# Altium footprint library ref-packages.PCBLIB: 1544 footprints (part 13 of 103)
Each footprint in its own frame and in the unit in brackets; x right, y up, seen from the top. Pads: shape width x height; smd on the part's side, far side on the other; paste and mask are expansions set on the pad; w line width, h text height; cw(c..) or ccw(c..) is an arc to the next point about the centre after c.
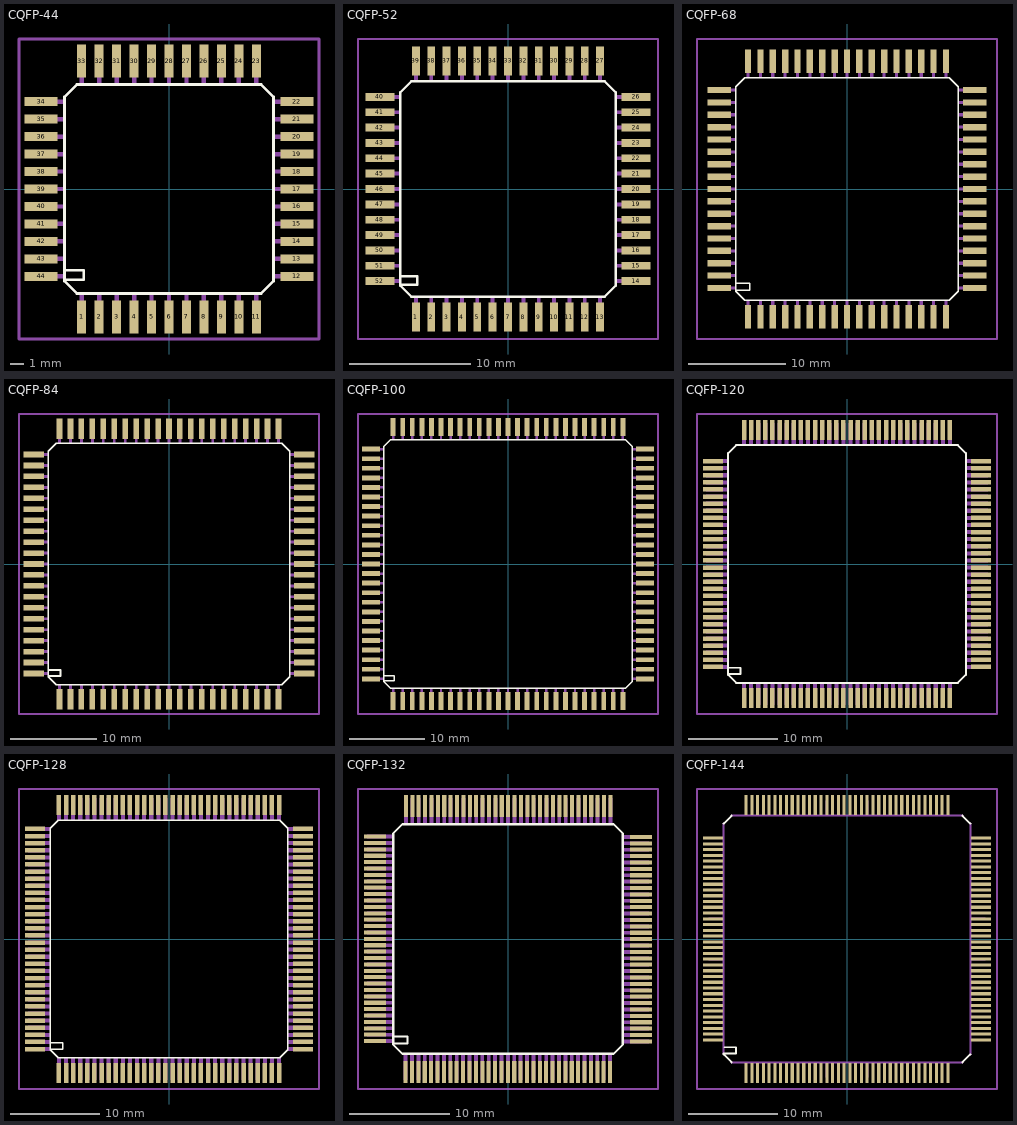
[diagram p12: the footprints below, top view; thin cyan lines are the x and y axes]

## CQFP-44 [mm]
pads (44):
  rect 0.65x2.4 smd: 1(-6.35,-9.3) 2(-5.08,-9.3) 3(-3.81,-9.3) 4(-2.54,-9.3) 5(-1.27,-9.3) 6(0,-9.3) 7(1.27,-9.3) 8(2.54,-9.3) 9(3.81,-9.3) 10(5.08,-9.3) 11(6.35,-9.3) 23(6.35,9.3) 24(5.08,9.3) 25(3.81,9.3) 26(2.54,9.3) 27(1.27,9.3) 28(0,9.3) 29(-1.27,9.3) 30(-2.54,9.3) 31(-3.81,9.3) 32(-5.08,9.3) 33(-6.35,9.3)
  rect 2.4x0.65 smd: 12(9.3,-6.35) 13(9.3,-5.08) 14(9.3,-3.81) 15(9.3,-2.54) 16(9.3,-1.27) 17(9.3,0) 18(9.3,1.27) 19(9.3,2.54) 20(9.3,3.81) 21(9.3,5.08) 22(9.3,6.35) 34(-9.3,6.35) 35(-9.3,5.08) 36(-9.3,3.81) 37(-9.3,2.54) 38(-9.3,1.27) 39(-9.3,0) 40(-9.3,-1.27) 41(-9.3,-2.54) 42(-9.3,-3.81) 43(-9.3,-5.08) 44(-9.3,-6.35)
Top Overlay:
  lines w0.203: -7.5,-5.9 -6.2,-5.9 -6.2,-6.6 -7.6,-6.6 ; -7.6,-6.6 -7.6,6.7 -6.7,7.6 6.7,7.6 7.6,6.7 7.6,-6.7 6.7,-7.6 -6.7,-7.6 -7.6,-6.7 -7.6,-6.6
Mechanical 16:
  rectangle: -6.51,-10.1 -6.19,-7.6
  rectangle: -5.24,-10.1 -4.92,-7.6
  rectangle: -3.97,-10.1 -3.65,-7.6
  rectangle: -2.7,-10.1 -2.38,-7.6
  rectangle: -1.43,-10.1 -1.11,-7.6
  rectangle: -0.16,-10.1 0.16,-7.6
  rectangle: 1.11,-10.1 1.43,-7.6
  rectangle: 2.38,-10.1 2.7,-7.6
  rectangle: 3.65,-10.1 3.97,-7.6
  rectangle: 4.92,-10.1 5.24,-7.6
  rectangle: 6.19,-10.1 6.51,-7.6
  rectangle: 7.6,-6.51 10.1,-6.19
  rectangle: 7.6,-5.24 10.1,-4.92
  rectangle: 7.6,-3.97 10.1,-3.65
  rectangle: 7.6,-2.7 10.1,-2.38
  rectangle: 7.6,-1.43 10.1,-1.11
  rectangle: 7.6,-0.16 10.1,0.16
  rectangle: 7.6,1.11 10.1,1.43
  rectangle: 7.6,2.38 10.1,2.7
  rectangle: 7.6,3.65 10.1,3.97
  rectangle: 7.6,4.92 10.1,5.24
  rectangle: 7.6,6.19 10.1,6.51
  rectangle: 6.19,7.6 6.51,10.1
  rectangle: 4.92,7.6 5.24,10.1
  rectangle: 3.65,7.6 3.97,10.1
  rectangle: 2.38,7.6 2.7,10.1
  rectangle: 1.11,7.6 1.43,10.1
  rectangle: -0.16,7.6 0.16,10.1
  rectangle: -1.43,7.6 -1.11,10.1
  rectangle: -2.7,7.6 -2.38,10.1
  rectangle: -3.97,7.6 -3.65,10.1
  rectangle: -5.24,7.6 -4.92,10.1
  rectangle: -6.51,7.6 -6.19,10.1
  rectangle: -10.1,6.19 -7.6,6.51
  rectangle: -10.1,4.92 -7.6,5.24
  rectangle: -10.1,3.65 -7.6,3.97
  rectangle: -10.1,2.38 -7.6,2.7
  rectangle: -10.1,1.11 -7.6,1.43
  rectangle: -10.1,-0.16 -7.6,0.16
  rectangle: -10.1,-1.43 -7.6,-1.11
  rectangle: -10.1,-2.7 -7.6,-2.38
  rectangle: -10.1,-3.97 -7.6,-3.65
  rectangle: -10.1,-5.24 -7.6,-4.92
  rectangle: -10.1,-6.51 -7.6,-6.19
Mechanical 27:
  lines w0.2: -10.903,-10.903 10.903,-10.903 10.903,10.903 -10.903,10.903 -10.903,-10.903

## CQFP-52 [mm]
pads (52):
  rect 0.65x2.4 smd: 1(-7.62,-10.6) 2(-6.35,-10.6) 3(-5.08,-10.6) 4(-3.81,-10.6) 5(-2.54,-10.6) 6(-1.27,-10.6) 7(0,-10.6) 8(1.27,-10.6) 9(2.54,-10.6) 10(3.81,-10.6) 11(5.08,-10.6) 12(6.35,-10.6) 13(7.62,-10.6) 27(7.62,10.6) 28(6.35,10.6) 29(5.08,10.6) 30(3.81,10.6) 31(2.54,10.6) 32(1.27,10.6) 33(0,10.6) 34(-1.27,10.6) 35(-2.54,10.6) 36(-3.81,10.6) 37(-5.08,10.6) 38(-6.35,10.6) 39(-7.62,10.6)
  rect 2.4x0.65 smd: 14(10.6,-7.62) 15(10.6,-6.35) 16(10.6,-5.08) 17(10.6,-3.81) 18(10.6,-2.54) 19(10.6,-1.27) 20(10.6,0) 21(10.6,1.27) 22(10.6,2.54) 23(10.6,3.81) 24(10.6,5.08) 25(10.6,6.35) 26(10.6,7.62) 40(-10.6,7.62) 41(-10.6,6.35) 42(-10.6,5.08) 43(-10.6,3.81) 44(-10.6,2.54) 45(-10.6,1.27) 46(-10.6,0) 47(-10.6,-1.27) 48(-10.6,-2.54) 49(-10.6,-3.81) 50(-10.6,-5.08) 51(-10.6,-6.35) 52(-10.6,-7.62)
Top Overlay:
  lines w0.203: -8.8,-7.2 -7.5,-7.2 -7.5,-7.9 -8.9,-7.9 ; -8.9,-7.9 -8.9,8 -8,8.9 8,8.9 8.9,8 8.9,-8 8,-8.9 -8,-8.9 -8.9,-8 -8.9,-7.9
Mechanical 16:
  rectangle: -7.78,-11.4 -7.46,-8.9
  rectangle: -6.51,-11.4 -6.19,-8.9
  rectangle: -5.24,-11.4 -4.92,-8.9
  rectangle: -3.97,-11.4 -3.65,-8.9
  rectangle: -2.7,-11.4 -2.38,-8.9
  rectangle: -1.43,-11.4 -1.11,-8.9
  rectangle: -0.16,-11.4 0.16,-8.9
  rectangle: 1.11,-11.4 1.43,-8.9
  rectangle: 2.38,-11.4 2.7,-8.9
  rectangle: 3.65,-11.4 3.97,-8.9
  rectangle: 4.92,-11.4 5.24,-8.9
  rectangle: 6.19,-11.4 6.51,-8.9
  rectangle: 7.46,-11.4 7.78,-8.9
  rectangle: 8.9,-7.78 11.4,-7.46
  rectangle: 8.9,-6.51 11.4,-6.19
  rectangle: 8.9,-5.24 11.4,-4.92
  rectangle: 8.9,-3.97 11.4,-3.65
  rectangle: 8.9,-2.7 11.4,-2.38
  rectangle: 8.9,-1.43 11.4,-1.11
  rectangle: 8.9,-0.16 11.4,0.16
  rectangle: 8.9,1.11 11.4,1.43
  rectangle: 8.9,2.38 11.4,2.7
  rectangle: 8.9,3.65 11.4,3.97
  rectangle: 8.9,4.92 11.4,5.24
  rectangle: 8.9,6.19 11.4,6.51
  rectangle: 8.9,7.46 11.4,7.78
  rectangle: 7.46,8.9 7.78,11.4
  rectangle: 6.19,8.9 6.51,11.4
  rectangle: 4.92,8.9 5.24,11.4
  rectangle: 3.65,8.9 3.97,11.4
  rectangle: 2.38,8.9 2.7,11.4
  rectangle: 1.11,8.9 1.43,11.4
  rectangle: -0.16,8.9 0.16,11.4
  rectangle: -1.43,8.9 -1.11,11.4
  rectangle: -2.7,8.9 -2.38,11.4
  rectangle: -3.97,8.9 -3.65,11.4
  rectangle: -5.24,8.9 -4.92,11.4
  rectangle: -6.51,8.9 -6.19,11.4
  rectangle: -7.78,8.9 -7.46,11.4
  rectangle: -11.4,7.46 -8.9,7.78
  rectangle: -11.4,6.19 -8.9,6.51
  rectangle: -11.4,4.92 -8.9,5.24
  rectangle: -11.4,3.65 -8.9,3.97
  rectangle: -11.4,2.38 -8.9,2.7
  rectangle: -11.4,1.11 -8.9,1.43
  rectangle: -11.4,-0.16 -8.9,0.16
  rectangle: -11.4,-1.43 -8.9,-1.11
  rectangle: -11.4,-2.7 -8.9,-2.38
  rectangle: -11.4,-3.97 -8.9,-3.65
  rectangle: -11.4,-5.24 -8.9,-4.92
  rectangle: -11.4,-6.51 -8.9,-6.19
  rectangle: -11.4,-7.78 -8.9,-7.46
Mechanical 27:
  lines w0.2: -12.403,-12.403 12.403,-12.403 12.403,12.403 -12.403,12.403 -12.403,-12.403

## CQFP-68 [mm]
pads (68):
  rect 0.65x2.4 smd: 1(-10.16,-13.1) 2(-8.89,-13.1) 3(-7.62,-13.1) 4(-6.35,-13.1) 5(-5.08,-13.1) 6(-3.81,-13.1) 7(-2.54,-13.1) 8(-1.27,-13.1) 9(0,-13.1) 10(1.27,-13.1) 11(2.54,-13.1) 12(3.81,-13.1) 13(5.08,-13.1) 14(6.35,-13.1) 15(7.62,-13.1) 16(8.89,-13.1) 17(10.16,-13.1) 35(10.16,13.1) 36(8.89,13.1) 37(7.62,13.1) 38(6.35,13.1) 39(5.08,13.1) 40(3.81,13.1) 41(2.54,13.1) 42(1.27,13.1) 43(0,13.1) 44(-1.27,13.1) 45(-2.54,13.1) 46(-3.81,13.1) 47(-5.08,13.1) 48(-6.35,13.1) 49(-7.62,13.1) 50(-8.89,13.1) 51(-10.16,13.1)
  rect 2.4x0.65 smd: 18(13.1,-10.16) 19(13.1,-8.89) 20(13.1,-7.62) 21(13.1,-6.35) 22(13.1,-5.08) 23(13.1,-3.81) 24(13.1,-2.54) 25(13.1,-1.27) 26(13.1,0) 27(13.1,1.27) 28(13.1,2.54) 29(13.1,3.81) 30(13.1,5.08) 31(13.1,6.35) 32(13.1,7.62) 33(13.1,8.89) 34(13.1,10.16) 52(-13.1,10.16) 53(-13.1,8.89) 54(-13.1,7.62) 55(-13.1,6.35) 56(-13.1,5.08) 57(-13.1,3.81) 58(-13.1,2.54) 59(-13.1,1.27) 60(-13.1,0) 61(-13.1,-1.27) 62(-13.1,-2.54) 63(-13.1,-3.81) 64(-13.1,-5.08) 65(-13.1,-6.35) 66(-13.1,-7.62) 67(-13.1,-8.89) 68(-13.1,-10.16)
Top Overlay:
  lines w0.152: -11.3,-9.7 -10,-9.7 -10,-10.4 -11.4,-10.4 ; -11.4,-10.4 -11.4,10.5 -10.5,11.4 10.5,11.4 11.4,10.5 11.4,-10.5 10.5,-11.4 -10.5,-11.4 -11.4,-10.5 -11.4,-10.4
Mechanical 16:
  rectangle: -10.32,-13.9 -10,-11.4
  rectangle: -9.05,-13.9 -8.73,-11.4
  rectangle: -7.78,-13.9 -7.46,-11.4
  rectangle: -6.51,-13.9 -6.19,-11.4
  rectangle: -5.24,-13.9 -4.92,-11.4
  rectangle: -3.97,-13.9 -3.65,-11.4
  rectangle: -2.7,-13.9 -2.38,-11.4
  rectangle: -1.43,-13.9 -1.11,-11.4
  rectangle: -0.16,-13.9 0.16,-11.4
  rectangle: 1.11,-13.9 1.43,-11.4
  rectangle: 2.38,-13.9 2.7,-11.4
  rectangle: 3.65,-13.9 3.97,-11.4
  rectangle: 4.92,-13.9 5.24,-11.4
  rectangle: 6.19,-13.9 6.51,-11.4
  rectangle: 7.46,-13.9 7.78,-11.4
  rectangle: 8.73,-13.9 9.05,-11.4
  rectangle: 10,-13.9 10.32,-11.4
  rectangle: 11.4,-10.32 13.9,-10
  rectangle: 11.4,-9.05 13.9,-8.73
  rectangle: 11.4,-7.78 13.9,-7.46
  rectangle: 11.4,-6.51 13.9,-6.19
  rectangle: 11.4,-5.24 13.9,-4.92
  rectangle: 11.4,-3.97 13.9,-3.65
  rectangle: 11.4,-2.7 13.9,-2.38
  rectangle: 11.4,-1.43 13.9,-1.11
  rectangle: 11.4,-0.16 13.9,0.16
  rectangle: 11.4,1.11 13.9,1.43
  rectangle: 11.4,2.38 13.9,2.7
  rectangle: 11.4,3.65 13.9,3.97
  rectangle: 11.4,4.92 13.9,5.24
  rectangle: 11.4,6.19 13.9,6.51
  rectangle: 11.4,7.46 13.9,7.78
  rectangle: 11.4,8.73 13.9,9.05
  rectangle: 11.4,10 13.9,10.32
  rectangle: 10,11.4 10.32,13.9
  rectangle: 8.73,11.4 9.05,13.9
  rectangle: 7.46,11.4 7.78,13.9
  rectangle: 6.19,11.4 6.51,13.9
  rectangle: 4.92,11.4 5.24,13.9
  rectangle: 3.65,11.4 3.97,13.9
  rectangle: 2.38,11.4 2.7,13.9
  rectangle: 1.11,11.4 1.43,13.9
  rectangle: -0.16,11.4 0.16,13.9
  rectangle: -1.43,11.4 -1.11,13.9
  rectangle: -2.7,11.4 -2.38,13.9
  rectangle: -3.97,11.4 -3.65,13.9
  rectangle: -5.24,11.4 -4.92,13.9
  rectangle: -6.51,11.4 -6.19,13.9
  rectangle: -7.78,11.4 -7.46,13.9
  rectangle: -9.05,11.4 -8.73,13.9
  rectangle: -10.32,11.4 -10,13.9
  rectangle: -13.9,10 -11.4,10.32
  rectangle: -13.9,8.73 -11.4,9.05
  rectangle: -13.9,7.46 -11.4,7.78
  rectangle: -13.9,6.19 -11.4,6.51
  rectangle: -13.9,4.92 -11.4,5.24
  rectangle: -13.9,3.65 -11.4,3.97
  rectangle: -13.9,2.38 -11.4,2.7
  rectangle: -13.9,1.11 -11.4,1.43
  rectangle: -13.9,-0.16 -11.4,0.16
  rectangle: -13.9,-1.43 -11.4,-1.11
  rectangle: -13.9,-2.7 -11.4,-2.38
  rectangle: -13.9,-3.97 -11.4,-3.65
  rectangle: -13.9,-5.24 -11.4,-4.92
  rectangle: -13.9,-6.51 -11.4,-6.19
  rectangle: -13.9,-7.78 -11.4,-7.46
  rectangle: -13.9,-9.05 -11.4,-8.73
  rectangle: -13.9,-10.32 -11.4,-10
Mechanical 27:
  lines w0.2: -15.403,-15.403 15.403,-15.403 15.403,15.403 -15.403,15.403 -15.403,-15.403

## CQFP-84 [mm]
pads (84):
  rect 0.65x2.4 smd: 1(-12.7,-15.7) 2(-11.43,-15.7) 3(-10.16,-15.7) 4(-8.89,-15.7) 5(-7.62,-15.7) 6(-6.35,-15.7) 7(-5.08,-15.7) 8(-3.81,-15.7) 9(-2.54,-15.7) 10(-1.27,-15.7) 11(0,-15.7) 12(1.27,-15.7) 13(2.54,-15.7) 14(3.81,-15.7) 15(5.08,-15.7) 16(6.35,-15.7) 17(7.62,-15.7) 18(8.89,-15.7) 19(10.16,-15.7) 20(11.43,-15.7) 21(12.7,-15.7) 43(12.7,15.7) 44(11.43,15.7) 45(10.16,15.7) 46(8.89,15.7) 47(7.62,15.7) 48(6.35,15.7) 49(5.08,15.7) 50(3.81,15.7) 51(2.54,15.7) 52(1.27,15.7) 53(0,15.7) 54(-1.27,15.7) 55(-2.54,15.7) 56(-3.81,15.7) 57(-5.08,15.7) 58(-6.35,15.7) 59(-7.62,15.7) 60(-8.89,15.7) 61(-10.16,15.7) 62(-11.43,15.7) 63(-12.7,15.7)
  rect 2.4x0.65 smd: 22(15.7,-12.7) 23(15.7,-11.43) 24(15.7,-10.16) 25(15.7,-8.89) 26(15.7,-7.62) 27(15.7,-6.35) 28(15.7,-5.08) 29(15.7,-3.81) 30(15.7,-2.54) 31(15.7,-1.27) 32(15.7,0) 33(15.7,1.27) 34(15.7,2.54) 35(15.7,3.81) 36(15.7,5.08) 37(15.7,6.35) 38(15.7,7.62) 39(15.7,8.89) 40(15.7,10.16) 41(15.7,11.43) 42(15.7,12.7) 64(-15.7,12.7) 65(-15.7,11.43) 66(-15.7,10.16) 67(-15.7,8.89) 68(-15.7,7.62) 69(-15.7,6.35) 70(-15.7,5.08) 71(-15.7,3.81) 72(-15.7,2.54) 73(-15.7,1.27) 74(-15.7,0) 75(-15.7,-1.27) 76(-15.7,-2.54) 77(-15.7,-3.81) 78(-15.7,-5.08) 79(-15.7,-6.35) 80(-15.7,-7.62) 81(-15.7,-8.89) 82(-15.7,-10.16) 83(-15.7,-11.43) 84(-15.7,-12.7)
Top Overlay:
  lines w0.203: -13.9,-12.3 -12.6,-12.3 -12.6,-13 -14,-13 ; -14,-13 -14,13.1 -13.1,14 13.1,14 14,13.1 14,-13.1 13.1,-14 -13.1,-14 -14,-13.1 -14,-13
Mechanical 16:
  rectangle: -12.86,-16.5 -12.54,-14
  rectangle: -11.59,-16.5 -11.27,-14
  rectangle: -10.32,-16.5 -10,-14
  rectangle: -9.05,-16.5 -8.73,-14
  rectangle: -7.78,-16.5 -7.46,-14
  rectangle: -6.51,-16.5 -6.19,-14
  rectangle: -5.24,-16.5 -4.92,-14
  rectangle: -3.97,-16.5 -3.65,-14
  rectangle: -2.7,-16.5 -2.38,-14
  rectangle: -1.43,-16.5 -1.11,-14
  rectangle: -0.16,-16.5 0.16,-14
  rectangle: 1.11,-16.5 1.43,-14
  rectangle: 2.38,-16.5 2.7,-14
  rectangle: 3.65,-16.5 3.97,-14
  rectangle: 4.92,-16.5 5.24,-14
  rectangle: 6.19,-16.5 6.51,-14
  rectangle: 7.46,-16.5 7.78,-14
  rectangle: 8.73,-16.5 9.05,-14
  rectangle: 10,-16.5 10.32,-14
  rectangle: 11.27,-16.5 11.59,-14
  rectangle: 12.54,-16.5 12.86,-14
  rectangle: 14,-12.86 16.5,-12.54
  rectangle: 14,-11.59 16.5,-11.27
  rectangle: 14,-10.32 16.5,-10
  rectangle: 14,-9.05 16.5,-8.73
  rectangle: 14,-7.78 16.5,-7.46
  rectangle: 14,-6.51 16.5,-6.19
  rectangle: 14,-5.24 16.5,-4.92
  rectangle: 14,-3.97 16.5,-3.65
  rectangle: 14,-2.7 16.5,-2.38
  rectangle: 14,-1.43 16.5,-1.11
  rectangle: 14,-0.16 16.5,0.16
  rectangle: 14,1.11 16.5,1.43
  rectangle: 14,2.38 16.5,2.7
  rectangle: 14,3.65 16.5,3.97
  rectangle: 14,4.92 16.5,5.24
  rectangle: 14,6.19 16.5,6.51
  rectangle: 14,7.46 16.5,7.78
  rectangle: 14,8.73 16.5,9.05
  rectangle: 14,10 16.5,10.32
  rectangle: 14,11.27 16.5,11.59
  rectangle: 14,12.54 16.5,12.86
  rectangle: 12.54,14 12.86,16.5
  rectangle: 11.27,14 11.59,16.5
  rectangle: 10,14 10.32,16.5
  rectangle: 8.73,14 9.05,16.5
  rectangle: 7.46,14 7.78,16.5
  rectangle: 6.19,14 6.51,16.5
  rectangle: 4.92,14 5.24,16.5
  rectangle: 3.65,14 3.97,16.5
  rectangle: 2.38,14 2.7,16.5
  rectangle: 1.11,14 1.43,16.5
  rectangle: -0.16,14 0.16,16.5
  rectangle: -1.43,14 -1.11,16.5
  rectangle: -2.7,14 -2.38,16.5
  rectangle: -3.97,14 -3.65,16.5
  rectangle: -5.24,14 -4.92,16.5
  rectangle: -6.51,14 -6.19,16.5
  rectangle: -7.78,14 -7.46,16.5
  rectangle: -9.05,14 -8.73,16.5
  rectangle: -10.32,14 -10,16.5
  rectangle: -11.59,14 -11.27,16.5
  rectangle: -12.86,14 -12.54,16.5
  rectangle: -16.5,12.54 -14,12.86
  rectangle: -16.5,11.27 -14,11.59
  rectangle: -16.5,10 -14,10.32
  rectangle: -16.5,8.73 -14,9.05
  rectangle: -16.5,7.46 -14,7.78
  rectangle: -16.5,6.19 -14,6.51
  rectangle: -16.5,4.92 -14,5.24
  rectangle: -16.5,3.65 -14,3.97
  rectangle: -16.5,2.38 -14,2.7
  rectangle: -16.5,1.11 -14,1.43
  rectangle: -16.5,-0.16 -14,0.16
  rectangle: -16.5,-1.43 -14,-1.11
  rectangle: -16.5,-2.7 -14,-2.38
  rectangle: -16.5,-3.97 -14,-3.65
  rectangle: -16.5,-5.24 -14,-4.92
  rectangle: -16.5,-6.51 -14,-6.19
  rectangle: -16.5,-7.78 -14,-7.46
  rectangle: -16.5,-9.05 -14,-8.73
  rectangle: -16.5,-10.32 -14,-10
  rectangle: -16.5,-11.59 -14,-11.27
  rectangle: -16.5,-12.86 -14,-12.54
Mechanical 27:
  lines w0.2: -17.403,-17.403 17.403,-17.403 17.403,17.403 -17.403,17.403 -17.403,-17.403

## CQFP-100 [mm]
pads (100):
  rect 0.65x2.4 smd: 1(-15.24,-18.2) 2(-13.97,-18.2) 3(-12.7,-18.2) 4(-11.43,-18.2) 5(-10.16,-18.2) 6(-8.89,-18.2) 7(-7.62,-18.2) 8(-6.35,-18.2) 9(-5.08,-18.2) 10(-3.81,-18.2) 11(-2.54,-18.2) 12(-1.27,-18.2) 13(0,-18.2) 14(1.27,-18.2) 15(2.54,-18.2) 16(3.81,-18.2) 17(5.08,-18.2) 18(6.35,-18.2) 19(7.62,-18.2) 20(8.89,-18.2) 21(10.16,-18.2) 22(11.43,-18.2) 23(12.7,-18.2) 24(13.97,-18.2) 25(15.24,-18.2) 51(15.24,18.2) 52(13.97,18.2) 53(12.7,18.2) 54(11.43,18.2) 55(10.16,18.2) 56(8.89,18.2) 57(7.62,18.2) 58(6.35,18.2) 59(5.08,18.2) 60(3.81,18.2) 61(2.54,18.2) 62(1.27,18.2) 63(0,18.2) 64(-1.27,18.2) 65(-2.54,18.2) 66(-3.81,18.2) 67(-5.08,18.2) 68(-6.35,18.2) 69(-7.62,18.2) 70(-8.89,18.2) 71(-10.16,18.2) 72(-11.43,18.2) 73(-12.7,18.2) 74(-13.97,18.2) 75(-15.24,18.2)
  rect 2.4x0.65 smd: 26(18.2,-15.24) 27(18.2,-13.97) 28(18.2,-12.7) 29(18.2,-11.43) 30(18.2,-10.16) 31(18.2,-8.89) 32(18.2,-7.62) 33(18.2,-6.35) 34(18.2,-5.08) 35(18.2,-3.81) 36(18.2,-2.54) 37(18.2,-1.27) 38(18.2,0) 39(18.2,1.27) 40(18.2,2.54) 41(18.2,3.81) 42(18.2,5.08) 43(18.2,6.35) 44(18.2,7.62) 45(18.2,8.89) 46(18.2,10.16) 47(18.2,11.43) 48(18.2,12.7) 49(18.2,13.97) 50(18.2,15.24) 76(-18.2,15.24) 77(-18.2,13.97) 78(-18.2,12.7) 79(-18.2,11.43) 80(-18.2,10.16) 81(-18.2,8.89) 82(-18.2,7.62) 83(-18.2,6.35) 84(-18.2,5.08) 85(-18.2,3.81) 86(-18.2,2.54) 87(-18.2,1.27) 88(-18.2,0) 89(-18.2,-1.27) 90(-18.2,-2.54) 91(-18.2,-3.81) 92(-18.2,-5.08) 93(-18.2,-6.35) 94(-18.2,-7.62) 95(-18.2,-8.89) 96(-18.2,-10.16) 97(-18.2,-11.43) 98(-18.2,-12.7) 99(-18.2,-13.97) 100(-18.2,-15.24)
Top Overlay:
  lines w0.203: -16.4,-14.8 -15.1,-14.8 -15.1,-15.5 -16.5,-15.5 ; -16.5,-15.5 -16.5,15.6 -15.6,16.5 15.6,16.5 16.5,15.6 16.5,-15.6 15.6,-16.5 -15.6,-16.5 -16.5,-15.6 -16.5,-15.5
Mechanical 16:
  rectangle: -15.4,-19 -15.08,-16.5
  rectangle: -14.13,-19 -13.81,-16.5
  rectangle: -12.86,-19 -12.54,-16.5
  rectangle: -11.59,-19 -11.27,-16.5
  rectangle: -10.32,-19 -10,-16.5
  rectangle: -9.05,-19 -8.73,-16.5
  rectangle: -7.78,-19 -7.46,-16.5
  rectangle: -6.51,-19 -6.19,-16.5
  rectangle: -5.24,-19 -4.92,-16.5
  rectangle: -3.97,-19 -3.65,-16.5
  rectangle: -2.7,-19 -2.38,-16.5
  rectangle: -1.43,-19 -1.11,-16.5
  rectangle: -0.16,-19 0.16,-16.5
  rectangle: 1.11,-19 1.43,-16.5
  rectangle: 2.38,-19 2.7,-16.5
  rectangle: 3.65,-19 3.97,-16.5
  rectangle: 4.92,-19 5.24,-16.5
  rectangle: 6.19,-19 6.51,-16.5
  rectangle: 7.46,-19 7.78,-16.5
  rectangle: 8.73,-19 9.05,-16.5
  rectangle: 10,-19 10.32,-16.5
  rectangle: 11.27,-19 11.59,-16.5
  rectangle: 12.54,-19 12.86,-16.5
  rectangle: 13.81,-19 14.13,-16.5
  rectangle: 15.08,-19 15.4,-16.5
  rectangle: 16.5,-15.4 19,-15.08
  rectangle: 16.5,-14.13 19,-13.81
  rectangle: 16.5,-12.86 19,-12.54
  rectangle: 16.5,-11.59 19,-11.27
  rectangle: 16.5,-10.32 19,-10
  rectangle: 16.5,-9.05 19,-8.73
  rectangle: 16.5,-7.78 19,-7.46
  rectangle: 16.5,-6.51 19,-6.19
  rectangle: 16.5,-5.24 19,-4.92
  rectangle: 16.5,-3.97 19,-3.65
  rectangle: 16.5,-2.7 19,-2.38
  rectangle: 16.5,-1.43 19,-1.11
  rectangle: 16.5,-0.16 19,0.16
  rectangle: 16.5,1.11 19,1.43
  rectangle: 16.5,2.38 19,2.7
  rectangle: 16.5,3.65 19,3.97
  rectangle: 16.5,4.92 19,5.24
  rectangle: 16.5,6.19 19,6.51
  rectangle: 16.5,7.46 19,7.78
  rectangle: 16.5,8.73 19,9.05
  rectangle: 16.5,10 19,10.32
  rectangle: 16.5,11.27 19,11.59
  rectangle: 16.5,12.54 19,12.86
  rectangle: 16.5,13.81 19,14.13
  rectangle: 16.5,15.08 19,15.4
  rectangle: 15.08,16.5 15.4,19
  rectangle: 13.81,16.5 14.13,19
  rectangle: 12.54,16.5 12.86,19
  rectangle: 11.27,16.5 11.59,19
  rectangle: 10,16.5 10.32,19
  rectangle: 8.73,16.5 9.05,19
  rectangle: 7.46,16.5 7.78,19
  rectangle: 6.19,16.5 6.51,19
  rectangle: 4.92,16.5 5.24,19
  rectangle: 3.65,16.5 3.97,19
  rectangle: 2.38,16.5 2.7,19
  rectangle: 1.11,16.5 1.43,19
  rectangle: -0.16,16.5 0.16,19
  rectangle: -1.43,16.5 -1.11,19
  rectangle: -2.7,16.5 -2.38,19
  rectangle: -3.97,16.5 -3.65,19
  rectangle: -5.24,16.5 -4.92,19
  rectangle: -6.51,16.5 -6.19,19
  rectangle: -7.78,16.5 -7.46,19
  rectangle: -9.05,16.5 -8.73,19
  rectangle: -10.32,16.5 -10,19
  rectangle: -11.59,16.5 -11.27,19
  rectangle: -12.86,16.5 -12.54,19
  rectangle: -14.13,16.5 -13.81,19
  rectangle: -15.4,16.5 -15.08,19
  rectangle: -19,15.08 -16.5,15.4
  rectangle: -19,13.81 -16.5,14.13
  rectangle: -19,12.54 -16.5,12.86
  rectangle: -19,11.27 -16.5,11.59
  rectangle: -19,10 -16.5,10.32
  rectangle: -19,8.73 -16.5,9.05
  rectangle: -19,7.46 -16.5,7.78
  rectangle: -19,6.19 -16.5,6.51
  rectangle: -19,4.92 -16.5,5.24
  rectangle: -19,3.65 -16.5,3.97
  rectangle: -19,2.38 -16.5,2.7
  rectangle: -19,1.11 -16.5,1.43
  rectangle: -19,-0.16 -16.5,0.16
  rectangle: -19,-1.43 -16.5,-1.11
  rectangle: -19,-2.7 -16.5,-2.38
  rectangle: -19,-3.97 -16.5,-3.65
  rectangle: -19,-5.24 -16.5,-4.92
  rectangle: -19,-6.51 -16.5,-6.19
  rectangle: -19,-7.78 -16.5,-7.46
  rectangle: -19,-9.05 -16.5,-8.73
  rectangle: -19,-10.32 -16.5,-10
  rectangle: -19,-11.59 -16.5,-11.27
  rectangle: -19,-12.86 -16.5,-12.54
  rectangle: -19,-14.13 -16.5,-13.81
  rectangle: -19,-15.4 -16.5,-15.08
Mechanical 27:
  lines w0.2: -19.903,-19.903 19.903,-19.903 19.903,19.903 -19.903,19.903 -19.903,-19.903

## CQFP-120 [mm]
pads (120):
  rect 0.5x2.2 smd: 1(-11.6,-15.1) 2(-10.8,-15.1) 3(-10,-15.1) 4(-9.2,-15.1) 5(-8.4,-15.1) 6(-7.6,-15.1) 7(-6.8,-15.1) 8(-6,-15.1) 9(-5.2,-15.1) 10(-4.4,-15.1) 11(-3.6,-15.1) 12(-2.8,-15.1) 13(-2,-15.1) 14(-1.2,-15.1) 15(-0.4,-15.1) 16(0.4,-15.1) 17(1.2,-15.1) 18(2,-15.1) 19(2.8,-15.1) 20(3.6,-15.1) 21(4.4,-15.1) 22(5.2,-15.1) 23(6,-15.1) 24(6.8,-15.1) 25(7.6,-15.1) 26(8.4,-15.1) 27(9.2,-15.1) 28(10,-15.1) 29(10.8,-15.1) 30(11.6,-15.1) 61(11.6,15.1) 62(10.8,15.1) 63(10,15.1) 64(9.2,15.1) 65(8.4,15.1) 66(7.6,15.1) 67(6.8,15.1) 68(6,15.1) 69(5.2,15.1) 70(4.4,15.1) 71(3.6,15.1) 72(2.8,15.1) 73(2,15.1) 74(1.2,15.1) 75(0.4,15.1) 76(-0.4,15.1) 77(-1.2,15.1) 78(-2,15.1) 79(-2.8,15.1) 80(-3.6,15.1) 81(-4.4,15.1) 82(-5.2,15.1) 83(-6,15.1) 84(-6.8,15.1) 85(-7.6,15.1) 86(-8.4,15.1) 87(-9.2,15.1) 88(-10,15.1) 89(-10.8,15.1) 90(-11.6,15.1)
  rect 2.2x0.5 smd: 31(15.1,-11.6) 32(15.1,-10.8) 33(15.1,-10) 34(15.1,-9.2) 35(15.1,-8.4) 36(15.1,-7.6) 37(15.1,-6.8) 38(15.1,-6) 39(15.1,-5.2) 40(15.1,-4.4) 41(15.1,-3.6) 42(15.1,-2.8) 43(15.1,-2) 44(15.1,-1.2) 45(15.1,-0.4) 46(15.1,0.4) 47(15.1,1.2) 48(15.1,2) 49(15.1,2.8) 50(15.1,3.6) 51(15.1,4.4) 52(15.1,5.2) 53(15.1,6) 54(15.1,6.8) 55(15.1,7.6) 56(15.1,8.4) 57(15.1,9.2) 58(15.1,10) 59(15.1,10.8) 60(15.1,11.6) 91(-15.1,11.6) 92(-15.1,10.8) 93(-15.1,10) 94(-15.1,9.2) 95(-15.1,8.4) 96(-15.1,7.6) 97(-15.1,6.8) 98(-15.1,6) 99(-15.1,5.2) 100(-15.1,4.4) 101(-15.1,3.6) 102(-15.1,2.8) 103(-15.1,2) 104(-15.1,1.2) 105(-15.1,0.4) 106(-15.1,-0.4) 107(-15.1,-1.2) 108(-15.1,-2) 109(-15.1,-2.8) 110(-15.1,-3.6) 111(-15.1,-4.4) 112(-15.1,-5.2) 113(-15.1,-6) 114(-15.1,-6.8) 115(-15.1,-7.6) 116(-15.1,-8.4) 117(-15.1,-9.2) 118(-15.1,-10) 119(-15.1,-10.8) 120(-15.1,-11.6)
Top Overlay:
  lines w0.203: -13.3,-11.7 -12,-11.7 -12,-12.4 -13.4,-12.4 ; -13.4,-12.4 -13.4,12.5 -12.5,13.4 12.5,13.4 13.4,12.5 13.4,-12.5 12.5,-13.4 -12.5,-13.4 -13.4,-12.5 -13.4,-12.4
Mechanical 16:
  rectangle: -11.83,-15.89 -11.37,-13.4
  rectangle: -11.03,-15.89 -10.57,-13.4
  rectangle: -10.23,-15.89 -9.77,-13.4
  rectangle: -9.43,-15.89 -8.97,-13.4
  rectangle: -8.63,-15.89 -8.17,-13.4
  rectangle: -7.83,-15.89 -7.37,-13.4
  rectangle: -7.03,-15.89 -6.57,-13.4
  rectangle: -6.23,-15.89 -5.77,-13.4
  rectangle: -5.43,-15.89 -4.97,-13.4
  rectangle: -4.63,-15.89 -4.17,-13.4
  rectangle: -3.83,-15.89 -3.37,-13.4
  rectangle: -3.03,-15.89 -2.57,-13.4
  rectangle: -2.23,-15.89 -1.77,-13.4
  rectangle: -1.43,-15.89 -0.97,-13.4
  rectangle: -0.63,-15.89 -0.17,-13.4
  rectangle: 0.17,-15.89 0.63,-13.4
  rectangle: 0.97,-15.89 1.43,-13.4
  rectangle: 1.77,-15.89 2.23,-13.4
  rectangle: 2.57,-15.89 3.03,-13.4
  rectangle: 3.37,-15.89 3.83,-13.4
  rectangle: 4.17,-15.89 4.63,-13.4
  rectangle: 4.97,-15.89 5.43,-13.4
  rectangle: 5.77,-15.89 6.23,-13.4
  rectangle: 6.57,-15.89 7.03,-13.4
  rectangle: 7.37,-15.89 7.83,-13.4
  rectangle: 8.17,-15.89 8.63,-13.4
  rectangle: 8.97,-15.89 9.43,-13.4
  rectangle: 9.77,-15.89 10.23,-13.4
  rectangle: 10.57,-15.89 11.03,-13.4
  rectangle: 11.37,-15.89 11.83,-13.4
  rectangle: 13.4,-11.83 15.89,-11.37
  rectangle: 13.4,-11.03 15.89,-10.57
  rectangle: 13.4,-10.23 15.89,-9.77
  rectangle: 13.4,-9.43 15.89,-8.97
  rectangle: 13.4,-8.63 15.89,-8.17
  rectangle: 13.4,-7.83 15.89,-7.37
  rectangle: 13.4,-7.03 15.89,-6.57
  rectangle: 13.4,-6.23 15.89,-5.77
  rectangle: 13.4,-5.43 15.89,-4.97
  rectangle: 13.4,-4.63 15.89,-4.17
  rectangle: 13.4,-3.83 15.89,-3.37
  rectangle: 13.4,-3.03 15.89,-2.57
  rectangle: 13.4,-2.23 15.89,-1.77